# Altium footprint library CONN_HDR_MINI_ST.PcbLib: 116 footprints (part 8 of 10) (continued)
## HDRMINI_M_1X40 [mm] "mini header (50mil pitch)" (continued)
3D body: height 7.3, standoff -2.5, extent -21.155,-0.2 -20.755,0.2
3D body: height 2.8, standoff 0, extent -21.59,-0.635 -20.32,0.635
3D body: height 7.3, standoff -2.5, extent -19.885,-0.2 -19.485,0.2
3D body: height 2.8, standoff 0, extent -20.32,-0.635 -19.05,0.635
3D body: height 7.3, standoff -2.5, extent -18.615,-0.2 -18.215,0.2
3D body: height 2.8, standoff 0, extent -19.05,-0.635 -17.78,0.635
3D body: height 7.3, standoff -2.5, extent -17.345,-0.2 -16.945,0.2
3D body: height 2.8, standoff 0, extent -17.78,-0.635 -16.51,0.635
3D body: height 7.3, standoff -2.5, extent -16.075,-0.2 -15.675,0.2
3D body: height 2.8, standoff 0, extent -16.51,-0.635 -15.24,0.635
3D body: height 7.3, standoff -2.5, extent -14.805,-0.2 -14.405,0.2
3D body: height 2.8, standoff 0, extent -15.24,-0.635 -13.97,0.635

## HDRMINI_M_2X2 [mm] "mini header (50mil pitch)"
pads (4):
  round 1 hole 0.7 mask+0.05: 1(-0.635,-0.635) 2(-0.635,0.635) 3(0.635,-0.635) 4(0.635,0.635)
Top Overlay:
  circle w0.2: c-1.778,-0.635 r0.2
  lines w0.2: -1.171,-0.035 -1.27,-0.2 -1.27,-1.27 -1.171,-1.435 -0.099,-1.435 0,-1.27 0.099,-1.435 1.171,-1.435 1.27,-1.27 1.27,-0.2 1.171,-0.035 ; -1.171,0.035 -1.27,0.2 -1.27,1.27 -1.171,1.435 -0.099,1.435 0,1.27 0.099,1.435 1.171,1.435 1.27,1.27 1.27,0.2 1.171,0.035
3D body: height 7.3, standoff -2.5, extent -0.835,0.435 -0.435,0.835
3D body: height 2.8, standoff 0, extent -1.27,0 0,1.27
3D body: height 7.3, standoff -2.5, extent 0.435,0.435 0.835,0.835
3D body: height 2.8, standoff 0, extent 0,0 1.27,1.27
3D body: height 7.3, standoff -2.5, extent -0.835,-0.835 -0.435,-0.435
3D body: height 2.8, standoff 0, extent -1.27,-1.27 0,0
3D body: height 7.3, standoff -2.5, extent 0.435,-0.835 0.835,-0.435
3D body: height 2.8, standoff 0, extent 0,-1.27 1.27,0

## HDRMINI_M_2X3 [mm] "mini header (50mil pitch)"
pads (6):
  round 1 hole 0.7 mask+0.05: 1(-1.27,-0.635) 2(-1.27,0.635) 3(0,-0.635) 4(0,0.635) 5(1.27,-0.635) 6(1.27,0.635)
Top Overlay:
  circle w0.2: c-2.413,-0.635 r0.2
  lines w0.2: -1.806,-0.035 -1.905,-0.2 -1.905,-1.27 -1.806,-1.435 -0.734,-1.435 -0.635,-1.27 -0.536,-1.435 0.536,-1.435 0.635,-1.27 0.734,-1.435 1.806,-1.435 1.905,-1.27 1.905,-0.2 1.806,-0.035 ; -1.806,0.035 -1.905,0.2 -1.905,1.27 -1.806,1.435 -0.734,1.435 -0.635,1.27 -0.536,1.435 0.536,1.435 0.635,1.27 0.734,1.435 1.806,1.435 1.905,1.27 1.905,0.2 1.806,0.035
3D body: height 7.3, standoff -2.5, extent -1.47,0.435 -1.07,0.835
3D body: height 2.8, standoff 0, extent -1.905,0 -0.635,1.27
3D body: height 7.3, standoff -2.5, extent -0.2,0.435 0.2,0.835
3D body: height 2.8, standoff 0, extent -0.635,0 0.635,1.27
3D body: height 7.3, standoff -2.5, extent -1.47,-0.835 -1.07,-0.435
3D body: height 2.8, standoff 0, extent -1.905,-1.27 -0.635,0
3D body: height 7.3, standoff -2.5, extent -0.2,-0.835 0.2,-0.435
3D body: height 2.8, standoff 0, extent -0.635,-1.27 0.635,0
3D body: height 7.3, standoff -2.5, extent 1.07,0.435 1.47,0.835
3D body: height 2.8, standoff 0, extent 0.635,0 1.905,1.27
3D body: height 7.3, standoff -2.5, extent 1.07,-0.835 1.47,-0.435
3D body: height 2.8, standoff 0, extent 0.635,-1.27 1.905,0

## HDRMINI_M_2X4 [mm] "mini header (50mil pitch)"
pads (8):
  round 1 hole 0.7 mask+0.05: 1(-1.905,-0.635) 2(-1.905,0.635) 3(-0.635,-0.635) 4(-0.635,0.635) 5(0.635,-0.635) 6(0.635,0.635) 7(1.905,-0.635) 8(1.905,0.635)
Top Overlay:
  circle w0.2: c-3.048,-0.635 r0.2
  lines w0.2: -2.441,-0.035 -2.54,-0.2 -2.54,-1.27 -2.441,-1.435 -1.369,-1.435 -1.27,-1.27 -1.171,-1.435 -0.099,-1.435 0,-1.27 0.099,-1.435 1.171,-1.435 1.27,-1.27 1.369,-1.435 2.441,-1.435 2.54,-1.27 2.54,-0.2 2.441,-0.035 ; -2.441,0.035 -2.54,0.2 -2.54,1.27 -2.441,1.435 -1.369,1.435 -1.27,1.27 -1.171,1.435 -0.099,1.435 0,1.27 0.099,1.435 1.171,1.435 1.27,1.27 1.369,1.435 2.441,1.435 2.54,1.27 2.54,0.2 2.441,0.035
3D body: height 2.8, standoff 0, extent 1.27,-1.27 2.54,0
3D body: height 7.3, standoff -2.5, extent 1.705,-0.835 2.105,-0.435
3D body: height 2.8, standoff 0, extent 0,-1.27 1.27,0
3D body: height 7.3, standoff -2.5, extent 0.435,-0.835 0.835,-0.435
3D body: height 2.8, standoff 0, extent 1.27,0 2.54,1.27
3D body: height 7.3, standoff -2.5, extent 1.705,0.435 2.105,0.835
3D body: height 2.8, standoff 0, extent 0,0 1.27,1.27
3D body: height 7.3, standoff -2.5, extent 0.435,0.435 0.835,0.835
3D body: height 2.8, standoff 0, extent -1.27,-1.27 0,0
3D body: height 7.3, standoff -2.5, extent -0.835,-0.835 -0.435,-0.435
3D body: height 2.8, standoff 0, extent -2.54,-1.27 -1.27,0
3D body: height 7.3, standoff -2.5, extent -2.105,-0.835 -1.705,-0.435
3D body: height 2.8, standoff 0, extent -1.27,0 0,1.27
3D body: height 7.3, standoff -2.5, extent -0.835,0.435 -0.435,0.835
3D body: height 2.8, standoff 0, extent -2.54,0 -1.27,1.27
3D body: height 7.3, standoff -2.5, extent -2.105,0.435 -1.705,0.835

## HDRMINI_M_2X5 [mm] "mini header (50mil pitch)"
pads (10):
  round 1 hole 0.7 mask+0.05: 1(-2.54,-0.635) 2(-2.54,0.635) 3(-1.27,-0.635) 4(-1.27,0.635) 5(0,-0.635) 6(0,0.635) 7(1.27,-0.635) 8(1.27,0.635) 9(2.54,-0.635) 10(2.54,0.635)
Top Overlay:
  circle w0.2: c-3.683,-0.635 r0.2
  lines w0.2: -3.076,-0.035 -3.175,-0.2 -3.175,-1.27 -3.076,-1.435 -2.004,-1.435 -1.905,-1.27 -1.806,-1.435 -0.734,-1.435 -0.635,-1.27 -0.536,-1.435 0.536,-1.435 0.635,-1.27 0.734,-1.435 1.806,-1.435 1.905,-1.27 2.004,-1.435 3.076,-1.435 3.175,-1.27 3.175,-0.2 3.076,-0.035 ; -3.076,0.035 -3.175,0.2 -3.175,1.27 -3.076,1.435 -2.004,1.435 -1.905,1.27 -1.806,1.435 -0.734,1.435 -0.635,1.27 -0.536,1.435 0.536,1.435 0.635,1.27 0.734,1.435 1.806,1.435 1.905,1.27 2.004,1.435 3.076,1.435 3.175,1.27 3.175,0.2 3.076,0.035
3D body: height 7.3, standoff -2.5, extent -2.74,0.435 -2.34,0.835
3D body: height 2.8, standoff 0, extent -3.175,0 -1.905,1.27
3D body: height 7.3, standoff -2.5, extent -1.47,0.435 -1.07,0.835
3D body: height 2.8, standoff 0, extent -1.905,0 -0.635,1.27
3D body: height 7.3, standoff -2.5, extent -2.74,-0.835 -2.34,-0.435
3D body: height 2.8, standoff 0, extent -3.175,-1.27 -1.905,0
3D body: height 7.3, standoff -2.5, extent -1.47,-0.835 -1.07,-0.435
3D body: height 2.8, standoff 0, extent -1.905,-1.27 -0.635,0
3D body: height 7.3, standoff -2.5, extent -0.2,0.435 0.2,0.835
3D body: height 2.8, standoff 0, extent -0.635,0 0.635,1.27
3D body: height 7.3, standoff -2.5, extent 1.07,0.435 1.47,0.835
3D body: height 2.8, standoff 0, extent 0.635,0 1.905,1.27
3D body: height 7.3, standoff -2.5, extent -0.2,-0.835 0.2,-0.435
3D body: height 2.8, standoff 0, extent -0.635,-1.27 0.635,0
3D body: height 7.3, standoff -2.5, extent 1.07,-0.835 1.47,-0.435
3D body: height 2.8, standoff 0, extent 0.635,-1.27 1.905,0
3D body: height 7.3, standoff -2.5, extent 2.34,0.435 2.74,0.835
3D body: height 2.8, standoff 0, extent 1.905,0 3.175,1.27
3D body: height 7.3, standoff -2.5, extent 2.34,-0.835 2.74,-0.435
3D body: height 2.8, standoff 0, extent 1.905,-1.27 3.175,0

## HDRMINI_M_2X6 [mm] "mini header (50mil pitch)"
pads (12):
  round 1 hole 0.7 mask+0.05: 1(-3.175,-0.635) 2(-3.175,0.635) 3(-1.905,-0.635) 4(-1.905,0.635) 5(-0.635,-0.635) 6(-0.635,0.635) 7(0.635,-0.635) 8(0.635,0.635) 9(1.905,-0.635) 10(1.905,0.635) 11(3.175,-0.635) 12(3.175,0.635)
Top Overlay:
  circle w0.2: c-4.318,-0.635 r0.2
  lines w0.2: -3.711,-0.035 -3.81,-0.2 -3.81,-1.27 -3.711,-1.435 -2.639,-1.435 -2.54,-1.27 -2.441,-1.435 -1.369,-1.435 -1.27,-1.27 -1.171,-1.435 -0.099,-1.435 0,-1.27 0.099,-1.435 1.171,-1.435 1.27,-1.27 1.369,-1.435 2.441,-1.435 2.54,-1.27 2.639,-1.435 3.711,-1.435 3.81,-1.27 3.81,-0.2 3.711,-0.035 ; -3.711,0.035 -3.81,0.2 -3.81,1.27 -3.711,1.435 -2.639,1.435 -2.54,1.27 -2.441,1.435 -1.369,1.435 -1.27,1.27 -1.171,1.435 -0.099,1.435 0,1.27 0.099,1.435 1.171,1.435 1.27,1.27 1.369,1.435 2.441,1.435 2.54,1.27 2.639,1.435 3.711,1.435 3.81,1.27 3.81,0.2 3.711,0.035
3D body: height 7.3, standoff -2.5, extent -3.375,0.435 -2.975,0.835
3D body: height 2.8, standoff 0, extent -3.81,0 -2.54,1.27
3D body: height 7.3, standoff -2.5, extent -2.105,0.435 -1.705,0.835
3D body: height 2.8, standoff 0, extent -2.54,0 -1.27,1.27
3D body: height 7.3, standoff -2.5, extent -3.375,-0.835 -2.975,-0.435
3D body: height 2.8, standoff 0, extent -3.81,-1.27 -2.54,0
3D body: height 7.3, standoff -2.5, extent -2.105,-0.835 -1.705,-0.435
3D body: height 2.8, standoff 0, extent -2.54,-1.27 -1.27,0
3D body: height 7.3, standoff -2.5, extent -0.835,0.435 -0.435,0.835
3D body: height 2.8, standoff 0, extent -1.27,0 0,1.27
3D body: height 7.3, standoff -2.5, extent 0.435,0.435 0.835,0.835
3D body: height 2.8, standoff 0, extent 0,0 1.27,1.27
3D body: height 7.3, standoff -2.5, extent -0.835,-0.835 -0.435,-0.435
3D body: height 2.8, standoff 0, extent -1.27,-1.27 0,0
3D body: height 7.3, standoff -2.5, extent 0.435,-0.835 0.835,-0.435
3D body: height 2.8, standoff 0, extent 0,-1.27 1.27,0
3D body: height 7.3, standoff -2.5, extent 1.705,0.435 2.105,0.835
3D body: height 2.8, standoff 0, extent 1.27,0 2.54,1.27
3D body: height 7.3, standoff -2.5, extent 2.975,0.435 3.375,0.835
3D body: height 2.8, standoff 0, extent 2.54,0 3.81,1.27
3D body: height 7.3, standoff -2.5, extent 1.705,-0.835 2.105,-0.435
3D body: height 2.8, standoff 0, extent 1.27,-1.27 2.54,0
3D body: height 7.3, standoff -2.5, extent 2.975,-0.835 3.375,-0.435
3D body: height 2.8, standoff 0, extent 2.54,-1.27 3.81,0

## HDRMINI_M_2X7 [mm] "mini header (50mil pitch)"
pads (14):
  round 1 hole 0.7 mask+0.05: 1(-3.81,-0.635) 2(-3.81,0.635) 3(-2.54,-0.635) 4(-2.54,0.635) 5(-1.27,-0.635) 6(-1.27,0.635) 7(0,-0.635) 8(0,0.635) 9(1.27,-0.635) 10(1.27,0.635) 11(2.54,-0.635) 12(2.54,0.635) 13(3.81,-0.635) 14(3.81,0.635)
Top Overlay:
  circle w0.2: c-4.953,-0.635 r0.2
  lines w0.2: -4.346,-0.035 -4.445,-0.2 -4.445,-1.27 -4.346,-1.435 -3.274,-1.435 -3.175,-1.27 -3.076,-1.435 -2.004,-1.435 -1.905,-1.27 -1.806,-1.435 -0.734,-1.435 -0.635,-1.27 -0.536,-1.435 0.536,-1.435 0.635,-1.27 0.734,-1.435 1.806,-1.435 1.905,-1.27 2.004,-1.435 3.076,-1.435 3.175,-1.27 3.274,-1.435 4.346,-1.435 4.445,-1.27 4.445,-0.2 4.346,-0.035 ; -4.346,0.035 -4.445,0.2 -4.445,1.27 -4.346,1.435 -3.274,1.435 -3.175,1.27 -3.076,1.435 -2.004,1.435 -1.905,1.27 -1.806,1.435 -0.734,1.435 -0.635,1.27 -0.536,1.435 0.536,1.435 0.635,1.27 0.734,1.435 1.806,1.435 1.905,1.27 2.004,1.435 3.076,1.435 3.175,1.27 3.274,1.435 4.346,1.435 4.445,1.27 4.445,0.2 4.346,0.035
3D body: height 7.3, standoff -2.5, extent -4.01,0.435 -3.61,0.835
3D body: height 2.8, standoff 0, extent -4.445,0 -3.175,1.27
3D body: height 7.3, standoff -2.5, extent -2.74,0.435 -2.34,0.835
3D body: height 2.8, standoff 0, extent -3.175,0 -1.905,1.27
3D body: height 7.3, standoff -2.5, extent -4.01,-0.835 -3.61,-0.435
3D body: height 2.8, standoff 0, extent -4.445,-1.27 -3.175,0
3D body: height 7.3, standoff -2.5, extent -2.74,-0.835 -2.34,-0.435
3D body: height 2.8, standoff 0, extent -3.175,-1.27 -1.905,0
3D body: height 7.3, standoff -2.5, extent -1.47,0.435 -1.07,0.835
3D body: height 2.8, standoff 0, extent -1.905,0 -0.635,1.27
3D body: height 7.3, standoff -2.5, extent -0.2,0.435 0.2,0.835
3D body: height 2.8, standoff 0, extent -0.635,0 0.635,1.27
3D body: height 7.3, standoff -2.5, extent -1.47,-0.835 -1.07,-0.435
3D body: height 2.8, standoff 0, extent -1.905,-1.27 -0.635,0
3D body: height 7.3, standoff -2.5, extent -0.2,-0.835 0.2,-0.435
3D body: height 2.8, standoff 0, extent -0.635,-1.27 0.635,0
3D body: height 7.3, standoff -2.5, extent 1.07,0.435 1.47,0.835
3D body: height 2.8, standoff 0, extent 0.635,0 1.905,1.27
3D body: height 7.3, standoff -2.5, extent 2.34,0.435 2.74,0.835
3D body: height 2.8, standoff 0, extent 1.905,0 3.175,1.27
3D body: height 7.3, standoff -2.5, extent 1.07,-0.835 1.47,-0.435
3D body: height 2.8, standoff 0, extent 0.635,-1.27 1.905,0
3D body: height 7.3, standoff -2.5, extent 2.34,-0.835 2.74,-0.435
3D body: height 2.8, standoff 0, extent 1.905,-1.27 3.175,0
3D body: height 7.3, standoff -2.5, extent 3.61,0.435 4.01,0.835
3D body: height 2.8, standoff 0, extent 3.175,0 4.445,1.27
3D body: height 7.3, standoff -2.5, extent 3.61,-0.835 4.01,-0.435
3D body: height 2.8, standoff 0, extent 3.175,-1.27 4.445,0

## HDRMINI_M_2X8 [mm] "mini header (50mil pitch)"
pads (16):
  round 1 hole 0.7 mask+0.05: 1(-4.445,-0.635) 2(-4.445,0.635) 3(-3.175,-0.635) 4(-3.175,0.635) 5(-1.905,-0.635) 6(-1.905,0.635) 7(-0.635,-0.635) 8(-0.635,0.635) 9(0.635,-0.635) 10(0.635,0.635) 11(1.905,-0.635) 12(1.905,0.635) 13(3.175,-0.635) 14(3.175,0.635) 15(4.445,-0.635) 16(4.445,0.635)
Top Overlay:
  circle w0.2: c-5.588,-0.635 r0.2
  lines w0.2: -4.981,-0.035 -5.08,-0.2 -5.08,-1.27 -4.981,-1.435 -3.909,-1.435 -3.81,-1.27 -3.711,-1.435 -2.639,-1.435 -2.54,-1.27 -2.441,-1.435 -1.369,-1.435 -1.27,-1.27 -1.171,-1.435 -0.099,-1.435 0,-1.27 0.099,-1.435 1.171,-1.435 1.27,-1.27 1.369,-1.435 2.441,-1.435 2.54,-1.27 2.639,-1.435 3.711,-1.435 3.81,-1.27 3.909,-1.435 4.981,-1.435 5.08,-1.27 5.08,-0.2 4.981,-0.035 ; -4.981,0.035 -5.08,0.2 -5.08,1.27 -4.981,1.435 -3.909,1.435 -3.81,1.27 -3.711,1.435 -2.639,1.435 -2.54,1.27 -2.441,1.435 -1.369,1.435 -1.27,1.27 -1.171,1.435 -0.099,1.435 0,1.27 0.099,1.435 1.171,1.435 1.27,1.27 1.369,1.435 2.441,1.435 2.54,1.27 2.639,1.435 3.711,1.435 3.81,1.27 3.909,1.435 4.981,1.435 5.08,1.27 5.08,0.2 4.981,0.035
3D body: height 7.3, standoff -2.5, extent -4.645,0.435 -4.245,0.835
3D body: height 2.8, standoff 0, extent -5.08,0 -3.81,1.27
3D body: height 7.3, standoff -2.5, extent -3.375,0.435 -2.975,0.835
3D body: height 2.8, standoff 0, extent -3.81,0 -2.54,1.27
3D body: height 7.3, standoff -2.5, extent -4.645,-0.835 -4.245,-0.435
3D body: height 2.8, standoff 0, extent -5.08,-1.27 -3.81,0
3D body: height 7.3, standoff -2.5, extent -3.375,-0.835 -2.975,-0.435
3D body: height 2.8, standoff 0, extent -3.81,-1.27 -2.54,0
3D body: height 7.3, standoff -2.5, extent -2.105,0.435 -1.705,0.835
3D body: height 2.8, standoff 0, extent -2.54,0 -1.27,1.27
3D body: height 7.3, standoff -2.5, extent -0.835,0.435 -0.435,0.835
3D body: height 2.8, standoff 0, extent -1.27,0 0,1.27
3D body: height 7.3, standoff -2.5, extent -2.105,-0.835 -1.705,-0.435
3D body: height 2.8, standoff 0, extent -2.54,-1.27 -1.27,0
3D body: height 7.3, standoff -2.5, extent -0.835,-0.835 -0.435,-0.435
3D body: height 2.8, standoff 0, extent -1.27,-1.27 0,0
3D body: height 7.3, standoff -2.5, extent 0.435,0.435 0.835,0.835
3D body: height 2.8, standoff 0, extent 0,0 1.27,1.27
3D body: height 7.3, standoff -2.5, extent 1.705,0.435 2.105,0.835
3D body: height 2.8, standoff 0, extent 1.27,0 2.54,1.27
3D body: height 7.3, standoff -2.5, extent 0.435,-0.835 0.835,-0.435
3D body: height 2.8, standoff 0, extent 0,-1.27 1.27,0
3D body: height 7.3, standoff -2.5, extent 1.705,-0.835 2.105,-0.435
3D body: height 2.8, standoff 0, extent 1.27,-1.27 2.54,0
3D body: height 7.3, standoff -2.5, extent 2.975,0.435 3.375,0.835
3D body: height 2.8, standoff 0, extent 2.54,0 3.81,1.27
3D body: height 7.3, standoff -2.5, extent 4.245,0.435 4.645,0.835
3D body: height 2.8, standoff 0, extent 3.81,0 5.08,1.27
3D body: height 7.3, standoff -2.5, extent 2.975,-0.835 3.375,-0.435
3D body: height 2.8, standoff 0, extent 2.54,-1.27 3.81,0
3D body: height 7.3, standoff -2.5, extent 4.245,-0.835 4.645,-0.435
3D body: height 2.8, standoff 0, extent 3.81,-1.27 5.08,0

## HDRMINI_M_2X9 [mm] "mini header (50mil pitch)"
pads (18):
  round 1 hole 0.7 mask+0.05: 1(-5.08,-0.635) 2(-5.08,0.635) 3(-3.81,-0.635) 4(-3.81,0.635) 5(-2.54,-0.635) 6(-2.54,0.635) 7(-1.27,-0.635) 8(-1.27,0.635) 9(0,-0.635) 10(0,0.635) 11(1.27,-0.635) 12(1.27,0.635) 13(2.54,-0.635) 14(2.54,0.635) 15(3.81,-0.635) 16(3.81,0.635) 17(5.08,-0.635) 18(5.08,0.635)
Top Overlay:
  circle w0.2: c-6.223,-0.635 r0.2
  lines w0.2: -5.616,-0.035 -5.715,-0.2 -5.715,-1.27 -5.616,-1.435 -4.544,-1.435 -4.445,-1.27 -4.346,-1.435 -3.274,-1.435 -3.175,-1.27 -3.076,-1.435 -2.004,-1.435 -1.905,-1.27 -1.806,-1.435 -0.734,-1.435 -0.635,-1.27 -0.536,-1.435 0.536,-1.435 0.635,-1.27 0.734,-1.435 1.806,-1.435 1.905,-1.27 2.004,-1.435 3.076,-1.435 3.175,-1.27 3.274,-1.435 4.346,-1.435 4.445,-1.27 4.544,-1.435 5.616,-1.435 5.715,-1.27 5.715,-0.2 5.616,-0.035 ; -5.616,0.035 -5.715,0.2 -5.715,1.27 -5.616,1.435 -4.544,1.435 -4.445,1.27 -4.346,1.435 -3.274,1.435 -3.175,1.27 -3.076,1.435 -2.004,1.435 -1.905,1.27 -1.806,1.435 -0.734,1.435 -0.635,1.27 -0.536,1.435 0.536,1.435 0.635,1.27 0.734,1.435 1.806,1.435 1.905,1.27 2.004,1.435 3.076,1.435 3.175,1.27 3.274,1.435 4.346,1.435 4.445,1.27 4.544,1.435 5.616,1.435 5.715,1.27 5.715,0.2 5.616,0.035
3D body: height 7.3, standoff -2.5, extent -5.28,0.435 -4.88,0.835
3D body: height 2.8, standoff 0, extent -5.715,0 -4.445,1.27
3D body: height 7.3, standoff -2.5, extent -4.01,0.435 -3.61,0.835
3D body: height 2.8, standoff 0, extent -4.445,0 -3.175,1.27
3D body: height 7.3, standoff -2.5, extent -5.28,-0.835 -4.88,-0.435
3D body: height 2.8, standoff 0, extent -5.715,-1.27 -4.445,0
3D body: height 7.3, standoff -2.5, extent -4.01,-0.835 -3.61,-0.435
3D body: height 2.8, standoff 0, extent -4.445,-1.27 -3.175,0
3D body: height 7.3, standoff -2.5, extent -2.74,0.435 -2.34,0.835
3D body: height 2.8, standoff 0, extent -3.175,0 -1.905,1.27
3D body: height 7.3, standoff -2.5, extent -1.47,0.435 -1.07,0.835
3D body: height 2.8, standoff 0, extent -1.905,0 -0.635,1.27
3D body: height 7.3, standoff -2.5, extent -2.74,-0.835 -2.34,-0.435
3D body: height 2.8, standoff 0, extent -3.175,-1.27 -1.905,0
3D body: height 7.3, standoff -2.5, extent -1.47,-0.835 -1.07,-0.435
3D body: height 2.8, standoff 0, extent -1.905,-1.27 -0.635,0
3D body: height 7.3, standoff -2.5, extent -0.2,0.435 0.2,0.835
3D body: height 2.8, standoff 0, extent -0.635,0 0.635,1.27
3D body: height 7.3, standoff -2.5, extent 1.07,0.435 1.47,0.835
3D body: height 2.8, standoff 0, extent 0.635,0 1.905,1.27
3D body: height 7.3, standoff -2.5, extent -0.2,-0.835 0.2,-0.435
3D body: height 2.8, standoff 0, extent -0.635,-1.27 0.635,0
3D body: height 7.3, standoff -2.5, extent 1.07,-0.835 1.47,-0.435
3D body: height 2.8, standoff 0, extent 0.635,-1.27 1.905,0
3D body: height 7.3, standoff -2.5, extent 2.34,0.435 2.74,0.835
3D body: height 2.8, standoff 0, extent 1.905,0 3.175,1.27
3D body: height 7.3, standoff -2.5, extent 3.61,0.435 4.01,0.835
3D body: height 2.8, standoff 0, extent 3.175,0 4.445,1.27
3D body: height 7.3, standoff -2.5, extent 2.34,-0.835 2.74,-0.435
3D body: height 2.8, standoff 0, extent 1.905,-1.27 3.175,0
3D body: height 7.3, standoff -2.5, extent 3.61,-0.835 4.01,-0.435
3D body: height 2.8, standoff 0, extent 3.175,-1.27 4.445,0
3D body: height 7.3, standoff -2.5, extent 4.88,0.435 5.28,0.835
3D body: height 2.8, standoff 0, extent 4.445,0 5.715,1.27
3D body: height 7.3, standoff -2.5, extent 4.88,-0.835 5.28,-0.435
3D body: height 2.8, standoff 0, extent 4.445,-1.27 5.715,0

## HDRMINI_M_2X10 [mm] "mini header (50mil pitch)"
pads (20):
  round 1 hole 0.7 mask+0.05: 1(-5.715,-0.635) 2(-5.715,0.635) 3(-4.445,-0.635) 4(-4.445,0.635) 5(-3.175,-0.635) 6(-3.175,0.635) 7(-1.905,-0.635) 8(-1.905,0.635) 9(-0.635,-0.635) 10(-0.635,0.635) 11(0.635,-0.635) 12(0.635,0.635) 13(1.905,-0.635) 14(1.905,0.635) 15(3.175,-0.635) 16(3.175,0.635) 17(4.445,-0.635) 18(4.445,0.635) 19(5.715,-0.635) 20(5.715,0.635)
Top Overlay:
  circle w0.2: c-6.858,-0.635 r0.2
  lines w0.2: -6.251,-0.035 -6.35,-0.2 -6.35,-1.27 -6.251,-1.435 -5.179,-1.435 -5.08,-1.27 -4.981,-1.435 -3.909,-1.435 -3.81,-1.27 -3.711,-1.435 -2.639,-1.435 -2.54,-1.27 -2.441,-1.435 -1.369,-1.435 -1.27,-1.27 -1.171,-1.435 -0.099,-1.435 0,-1.27 0.099,-1.435 1.171,-1.435 1.27,-1.27 1.369,-1.435 2.441,-1.435 2.54,-1.27 2.639,-1.435 3.711,-1.435 3.81,-1.27 3.909,-1.435 4.981,-1.435 5.08,-1.27 5.179,-1.435 6.251,-1.435 6.35,-1.27 6.35,-0.2 6.251,-0.035 ; -6.251,0.035 -6.35,0.2 -6.35,1.27 -6.251,1.435 -5.179,1.435 -5.08,1.27 -4.981,1.435 -3.909,1.435 -3.81,1.27 -3.711,1.435 -2.639,1.435 -2.54,1.27 -2.441,1.435 -1.369,1.435 -1.27,1.27 -1.171,1.435 -0.099,1.435 0,1.27 0.099,1.435 1.171,1.435 1.27,1.27 1.369,1.435 2.441,1.435 2.54,1.27 2.639,1.435 3.711,1.435 3.81,1.27 3.909,1.435 4.981,1.435 5.08,1.27 5.179,1.435 6.251,1.435 6.35,1.27 6.35,0.2 6.251,0.035
3D body: height 7.3, standoff -2.5, extent -5.915,0.435 -5.515,0.835
3D body: height 2.8, standoff 0, extent -6.35,0 -5.08,1.27
3D body: height 7.3, standoff -2.5, extent -4.645,0.435 -4.245,0.835
3D body: height 2.8, standoff 0, extent -5.08,0 -3.81,1.27
3D body: height 7.3, standoff -2.5, extent -5.915,-0.835 -5.515,-0.435
3D body: height 2.8, standoff 0, extent -6.35,-1.27 -5.08,0
3D body: height 7.3, standoff -2.5, extent -4.645,-0.835 -4.245,-0.435
3D body: height 2.8, standoff 0, extent -5.08,-1.27 -3.81,0
3D body: height 7.3, standoff -2.5, extent -3.375,0.435 -2.975,0.835
3D body: height 2.8, standoff 0, extent -3.81,0 -2.54,1.27
3D body: height 7.3, standoff -2.5, extent -2.105,0.435 -1.705,0.835
3D body: height 2.8, standoff 0, extent -2.54,0 -1.27,1.27
3D body: height 7.3, standoff -2.5, extent -3.375,-0.835 -2.975,-0.435
3D body: height 2.8, standoff 0, extent -3.81,-1.27 -2.54,0
3D body: height 7.3, standoff -2.5, extent -2.105,-0.835 -1.705,-0.435
3D body: height 2.8, standoff 0, extent -2.54,-1.27 -1.27,0
3D body: height 7.3, standoff -2.5, extent -0.835,0.435 -0.435,0.835
3D body: height 2.8, standoff 0, extent -1.27,0 0,1.27
3D body: height 7.3, standoff -2.5, extent 0.435,0.435 0.835,0.835
3D body: height 2.8, standoff 0, extent 0,0 1.27,1.27
3D body: height 7.3, standoff -2.5, extent -0.835,-0.835 -0.435,-0.435
3D body: height 2.8, standoff 0, extent -1.27,-1.27 0,0
3D body: height 7.3, standoff -2.5, extent 0.435,-0.835 0.835,-0.435
3D body: height 2.8, standoff 0, extent 0,-1.27 1.27,0
3D body: height 7.3, standoff -2.5, extent 1.705,0.435 2.105,0.835
3D body: height 2.8, standoff 0, extent 1.27,0 2.54,1.27
3D body: height 7.3, standoff -2.5, extent 2.975,0.435 3.375,0.835
3D body: height 2.8, standoff 0, extent 2.54,0 3.81,1.27
3D body: height 7.3, standoff -2.5, extent 1.705,-0.835 2.105,-0.435
3D body: height 2.8, standoff 0, extent 1.27,-1.27 2.54,0
3D body: height 7.3, standoff -2.5, extent 2.975,-0.835 3.375,-0.435
3D body: height 2.8, standoff 0, extent 2.54,-1.27 3.81,0
3D body: height 7.3, standoff -2.5, extent 4.245,0.435 4.645,0.835
3D body: height 2.8, standoff 0, extent 3.81,0 5.08,1.27
3D body: height 7.3, standoff -2.5, extent 5.515,0.435 5.915,0.835
3D body: height 2.8, standoff 0, extent 5.08,0 6.35,1.27
3D body: height 7.3, standoff -2.5, extent 4.245,-0.835 4.645,-0.435
3D body: height 2.8, standoff 0, extent 3.81,-1.27 5.08,0
3D body: height 7.3, standoff -2.5, extent 5.515,-0.835 5.915,-0.435
3D body: height 2.8, standoff 0, extent 5.08,-1.27 6.35,0

## HDRMINI_M_2X11 [mm] "mini header (50mil pitch)"
pads (22):
  round 1 hole 0.7 mask+0.05: 1(-6.35,-0.635) 2(-6.35,0.635) 3(-5.08,-0.635) 4(-5.08,0.635) 5(-3.81,-0.635) 6(-3.81,0.635) 7(-2.54,-0.635) 8(-2.54,0.635) 9(-1.27,-0.635) 10(-1.27,0.635) 11(0,-0.635) 12(0,0.635) 13(1.27,-0.635) 14(1.27,0.635) 15(2.54,-0.635) 16(2.54,0.635) 17(3.81,-0.635) 18(3.81,0.635) 19(5.08,-0.635) 20(5.08,0.635) 21(6.35,-0.635) 22(6.35,0.635)
Top Overlay:
  circle w0.2: c-7.493,-0.635 r0.2
  lines w0.2: -6.886,-0.035 -6.985,-0.2 -6.985,-1.27 -6.886,-1.435 -5.814,-1.435 -5.715,-1.27 -5.616,-1.435 -4.544,-1.435 -4.445,-1.27 -4.346,-1.435 -3.274,-1.435 -3.175,-1.27 -3.076,-1.435 -2.004,-1.435 -1.905,-1.27 -1.806,-1.435 -0.734,-1.435 -0.635,-1.27 -0.536,-1.435 0.536,-1.435 0.635,-1.27 0.734,-1.435 1.806,-1.435 1.905,-1.27 2.004,-1.435 3.076,-1.435 3.175,-1.27 3.274,-1.435 4.346,-1.435 4.445,-1.27 4.544,-1.435 5.616,-1.435 5.715,-1.27 5.814,-1.435 6.886,-1.435 6.985,-1.27 6.985,-0.2 6.886,-0.035 ; -6.886,0.035 -6.985,0.2 -6.985,1.27 -6.886,1.435 -5.814,1.435 -5.715,1.27 -5.616,1.435 -4.544,1.435 -4.445,1.27 -4.346,1.435 -3.274,1.435 -3.175,1.27 -3.076,1.435 -2.004,1.435 -1.905,1.27 -1.806,1.435 -0.734,1.435 -0.635,1.27 -0.536,1.435 0.536,1.435 0.635,1.27 0.734,1.435 1.806,1.435 1.905,1.27 2.004,1.435 3.076,1.435 3.175,1.27 3.274,1.435 4.346,1.435 4.445,1.27 4.544,1.435 5.616,1.435 5.715,1.27 5.814,1.435 6.886,1.435 6.985,1.27 6.985,0.2 6.886,0.035
3D body: height 7.3, standoff -2.5, extent -6.55,0.435 -6.15,0.835
3D body: height 2.8, standoff 0, extent -6.985,0 -5.715,1.27
3D body: height 7.3, standoff -2.5, extent -5.28,0.435 -4.88,0.835
3D body: height 2.8, standoff 0, extent -5.715,0 -4.445,1.27
3D body: height 7.3, standoff -2.5, extent -6.55,-0.835 -6.15,-0.435
3D body: height 2.8, standoff 0, extent -6.985,-1.27 -5.715,0
3D body: height 7.3, standoff -2.5, extent -5.28,-0.835 -4.88,-0.435
3D body: height 2.8, standoff 0, extent -5.715,-1.27 -4.445,0
3D body: height 7.3, standoff -2.5, extent -4.01,0.435 -3.61,0.835
3D body: height 2.8, standoff 0, extent -4.445,0 -3.175,1.27
3D body: height 7.3, standoff -2.5, extent -2.74,0.435 -2.34,0.835
3D body: height 2.8, standoff 0, extent -3.175,0 -1.905,1.27
3D body: height 7.3, standoff -2.5, extent -4.01,-0.835 -3.61,-0.435
3D body: height 2.8, standoff 0, extent -4.445,-1.27 -3.175,0
3D body: height 7.3, standoff -2.5, extent -2.74,-0.835 -2.34,-0.435
3D body: height 2.8, standoff 0, extent -3.175,-1.27 -1.905,0
3D body: height 7.3, standoff -2.5, extent -1.47,0.435 -1.07,0.835
3D body: height 2.8, standoff 0, extent -1.905,0 -0.635,1.27
3D body: height 7.3, standoff -2.5, extent -0.2,0.435 0.2,0.835
3D body: height 2.8, standoff 0, extent -0.635,0 0.635,1.27
3D body: height 7.3, standoff -2.5, extent -1.47,-0.835 -1.07,-0.435
3D body: height 2.8, standoff 0, extent -1.905,-1.27 -0.635,0
3D body: height 7.3, standoff -2.5, extent -0.2,-0.835 0.2,-0.435
3D body: height 2.8, standoff 0, extent -0.635,-1.27 0.635,0
3D body: height 7.3, standoff -2.5, extent 1.07,0.435 1.47,0.835
3D body: height 2.8, standoff 0, extent 0.635,0 1.905,1.27
3D body: height 7.3, standoff -2.5, extent 2.34,0.435 2.74,0.835
3D body: height 2.8, standoff 0, extent 1.905,0 3.175,1.27
3D body: height 7.3, standoff -2.5, extent 1.07,-0.835 1.47,-0.435
3D body: height 2.8, standoff 0, extent 0.635,-1.27 1.905,0
3D body: height 7.3, standoff -2.5, extent 2.34,-0.835 2.74,-0.435
3D body: height 2.8, standoff 0, extent 1.905,-1.27 3.175,0
3D body: height 7.3, standoff -2.5, extent 3.61,0.435 4.01,0.835
3D body: height 2.8, standoff 0, extent 3.175,0 4.445,1.27
3D body: height 7.3, standoff -2.5, extent 4.88,0.435 5.28,0.835
3D body: height 2.8, standoff 0, extent 4.445,0 5.715,1.27
3D body: height 7.3, standoff -2.5, extent 3.61,-0.835 4.01,-0.435
3D body: height 2.8, standoff 0, extent 3.175,-1.27 4.445,0
3D body: height 7.3, standoff -2.5, extent 4.88,-0.835 5.28,-0.435
3D body: height 2.8, standoff 0, extent 4.445,-1.27 5.715,0
3D body: height 7.3, standoff -2.5, extent 6.15,0.435 6.55,0.835
3D body: height 2.8, standoff 0, extent 5.715,0 6.985,1.27
3D body: height 7.3, standoff -2.5, extent 6.15,-0.835 6.55,-0.435
3D body: height 2.8, standoff 0, extent 5.715,-1.27 6.985,0